# Altium footprint library Zmod.PcbLib: 229 footprints (part 2 of 15)
Each footprint in its own frame and in the unit in brackets; x right, y up, seen from the top. Pads: shape width x height; smd on the part's side, far side on the other; paste and mask are expansions set on the pad; w line width, h text height; cw(c..) or ccw(c..) is an arc to the next point about the centre after c.
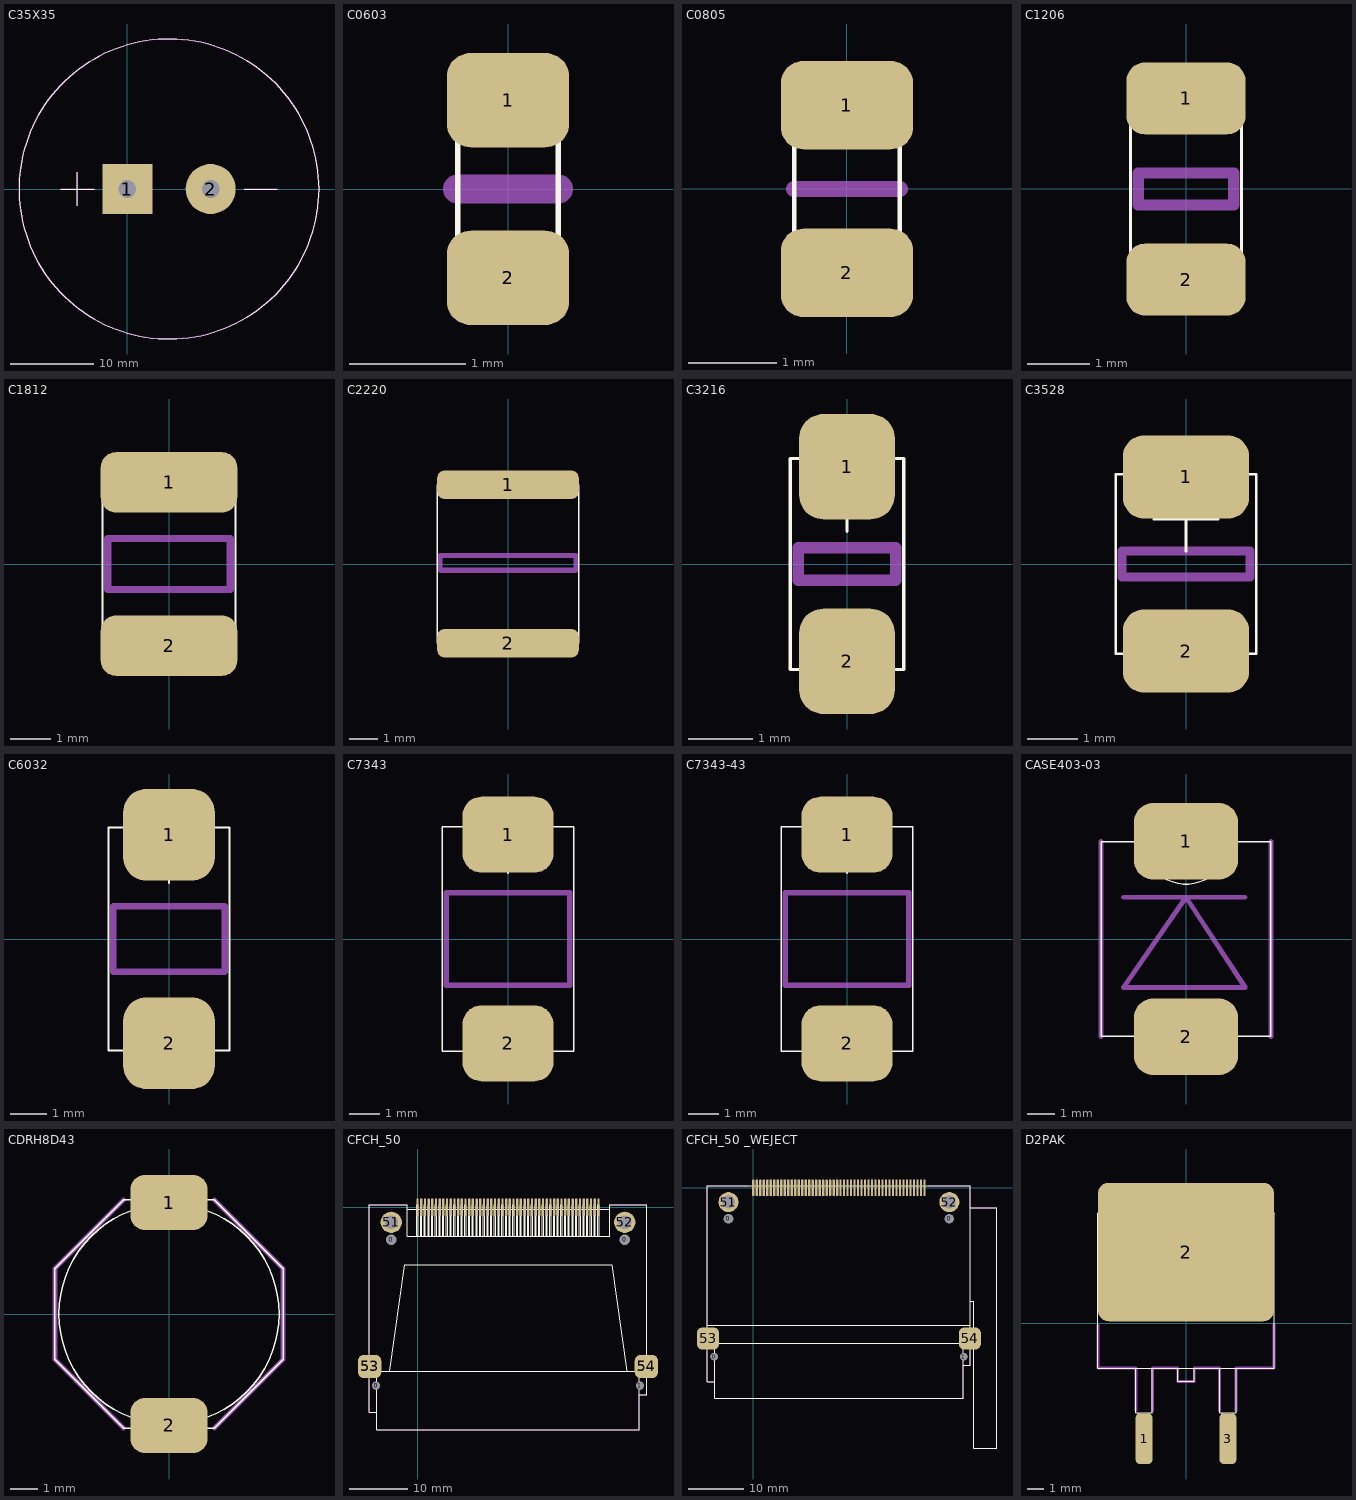
[diagram p1: the footprints below, top view; thin cyan lines are the x and y axes]

## C35X35 [mm] "Diameter 10mm pitch, 35mm, height 37mm, Rev. 1"
height 37
pads (2):
  rect 6x6 hole 2.1: 1(0,0)
  round 6 hole 2.1: 2(10,0)
Top Overlay:
  circle w0.05: c5,0 r18
  lines w0.05: -8,0 -4,0 ; -6,-2 -6,2 ; 14,0 18,0
  text ".Designator" at -1.2,4.3 h1.5
Mechanical 15:
  circle w0.18: c5,0 r18
  lines w0.18: -8,0 -4,0 ; -6,-2 -6,2 ; 14,0 18,0

## C0603 [mm]
height 0.889
pads (2):
  rrect50% 1.05x0.81 smd: 1(0,0.762) 2(0,-0.762)
Top Overlay:
  lines w0.05: -0.432,-0.787 0.432,-0.787 0.432,0.787 -0.432,0.787 -0.432,-0.787
Mechanical 15:
  lines w0.25: -0.432,0 0.432,0
  text ".Designator" at 0,-0.127 h1.5

## C0805 [mm] "Rev.1"
height 0.75
pads (2):
  rrect50% 1.5x1 smd: 1(0,0.95) 2(0,-0.95)
Top Overlay:
  lines w0.05: -0.6,0.75 -0.6,1 0.15,1 0.6,1 0.6,-1 -0.6,-1 -0.6,0.8
Mechanical 15:
  lines w0.18: -0.6,0 0.6,0
  text ".Designator" at 0.3,-1 h1.5

## C1206 [mm]
height 1.524
pads (2):
  rrect50% 1.9x1.15 smd: 1(0,1.448) 2(0,-1.448)
Top Overlay:
  lines w0.05: -0.889,-1.651 -0.889,1.651 0.889,1.651 0.889,-1.651 -0.889,-1.651
Mechanical 15:
  lines w0.18: -0.762,-0.254 -0.762,0.254 0.762,0.254 0.762,-0.254 -0.762,-0.254
  text ".Designator" at -0.127,0 h1.5

## C1812 [mm]
height 1.905
pads (2):
  rrect50% 3.4x1.5 smd: 1(0,2.032) 2(0,-2.032)
Top Overlay:
  lines w0.05: -1.651,-2.286 -1.651,2.286 1.651,2.286 1.651,-2.286 -1.651,-2.286
Mechanical 15:
  lines w0.18: -1.524,-0.635 -1.524,0.635 1.524,0.635 1.524,-0.635 -1.524,-0.635
  text ".Designator" at 0,-0.127 h1.5

## C2220 [mm] "AVX Rev. 2"
height 1
pads (2):
  rrect50% 5x1 smd: 1(0,2.8) 2(0,-2.8)
Top Overlay:
  lines w0.05: 2.5,-0.167 2.5,2.8 ; 2.5,2.8 -2.5,2.8 -2.5,-2.8 2.5,-2.8 2.5,2.8
Mechanical 15:
  lines w0.18: -2.4,-0.2 -2.38,-0.22 2.38,-0.22 2.4,-0.2 2.4,0.3 -2.4,0.3 -2.4,-0.2
  text ".Designator" at -0.127,0 h1.5

## C3216 [mm]
height 1.905
pads (2):
  rrect50% 1.5x1.65 smd: 1(0,1.524) 2(0,-1.524)
Top Overlay:
  lines w0.05: -0.508,1.016 0.508,1.016 ; 0,0.508 0,1.524 ; -0.889,-1.651 -0.889,1.651 0.889,1.651 0.889,-1.651 -0.889,-1.651
Mechanical 15:
  lines w0.18: -0.762,-0.254 -0.762,0.254 0.762,0.254 0.762,-0.254 -0.762,-0.254
  text ".Designator" at 0,0 h1.5
  text "+" at -0.127,0.254 h2

## C3528 [mm]
height 2.159
pads (2):
  rrect50% 2.5x1.65 smd paste+0: 1(0,1.727) 2(0,-1.727)
Top Overlay:
  lines w0.05: -0.635,0.889 0.635,0.889 ; 0,0.254 0,1.524 ; -1.397,-1.778 -1.397,1.778 1.397,1.778 1.397,-1.778 -1.397,-1.778
Mechanical 15:
  lines w0.18: -1.27,-0.254 -1.27,0.254 1.27,0.254 1.27,-0.254 -1.27,-0.254
  text ".Designator" at 0,0.254 h1.5
  text "+" at 0.127,0.254 h2

## C6032 [mm]
height 2.794
pads (2):
  rrect50% 2.5x2.5 smd paste+0: 1(0,2.845) 2(0,-2.845)
Top Overlay:
  lines w0.05: -0.635,2.159 0.635,2.159 ; 0,1.524 0,2.794 ; -1.651,-3.048 1.651,-3.048 1.651,3.048 -1.651,3.048 -1.651,-3.048
Mechanical 15:
  lines w0.18: -1.524,-0.889 1.524,-0.889 1.524,0.889 -1.524,0.889 -1.524,-0.889
  text ".Designator" at 0,0 h1.5
  text "+" at 0.381,1.143 h2

## C7343 [mm]
height 3.175
pads (2):
  rrect50% 3x2.5 smd paste+0: 1(0,3.429) 2(0,-3.429)
Top Overlay:
  lines w0.05: -0.635,2.794 0.635,2.794 ; 0,2.159 0,3.429 ; -2.159,-3.683 -2.159,3.683 2.159,3.683 2.159,-3.683 -2.159,-3.683
Mechanical 15:
  lines w0.18: -2.032,-1.524 -2.032,1.524 2.032,1.524 2.032,-1.524 -2.032,-1.524
  text "+" at 0.508,1.905 h2
  text ".Designator" at 0,0 h1.5

## C7343-43 [mm] "Rev. 1 Kemet T495 Case size X"
height 4.3
pads (2):
  rrect50% 3x2.5 smd paste+0: 1(0,3.429) 2(0,-3.429)
Top Overlay:
  lines w0.05: -0.635,2.794 0.635,2.794 ; 0,2.159 0,3.429 ; -2.159,-3.683 2.159,-3.683 2.159,3.683 -2.159,3.683 -2.159,-3.683
Mechanical 15:
  lines w0.18: -2.032,-1.524 2.032,-1.524 2.032,1.524 -2.032,1.524 -2.032,-1.524
  text ".Designator" at 0,0 h1.5
  text "+" at 0.508,1.905 h2

## CASE403-03 [mm] "OnSemi device, body L7.11,W6.1. Rev. 1"
height 2.41
pads (2):
  rrect50% 3.81x2.8 smd: 1(0,3.57) 2(0,-3.57)
Top Overlay:
  lines w0.05: -1.524,-3.556 -1.524,-4.064 1.524,-4.064 1.524,-3.556 ; -1.524,3.556 -1.524,4.064 1.524,4.064 1.524,3.556 ; -1.5,3.5 ccw(c0,3.5) 1.5,3.5 ; -3.1,-3.556 -3.1,3.556 3.1,3.556 3.1,-3.556 -3.1,-3.556
Mechanical 15:
  lines w0.18: -3.1,-3.556 -3.1,3.556 ; -2.286,1.524 2.159,1.524 ; 3.1,-3.556 3.1,3.556 ; -2.286,-1.778 2.159,-1.778 0,1.524 -2.286,-1.778
  text ".Designator" at 0.776,-3.829 h1.5

## CDRH8D43 [mm] "Sumida Inductor"
height 4.5
pads (2):
  rrect50% 2.8x2 smd: 1(0,4.05) 2(0,-4.05)
Top Overlay:
  circle w0.05: c0,0 r4
  lines w0.05: -4.15,-1.65 -1.65,-4.15 1.65,-4.15 4.15,-1.65 4.15,1.65 1.65,4.15 -1.65,4.15 -4.15,1.65 -4.15,-1.65
Mechanical 15:
  lines w0.18: -1.65,-4.15 -4.15,-1.65 -4.15,1.65 -1.65,4.15 ; 1.65,-4.15 4.15,-1.65 4.15,1.65 1.65,4.15
  text ".Designator" at -3.3,0 h1.5

## CFCH_50 [mm] "Connector; CompactFlash Card Header, SM; Normal Polarization; 50 Position; Right Angle; Pitch 0.635 mm"
height 8.3
pads (58):
  round 1.35 hole 1.35: 0(-7.14,-30.7) 1(38.26,-30.7)
  round 1.4 hole 1.75 unplated: 0(-4.52,-5.6) 0(35.64,-5.6)
  rrect50% 0.4x3 smd: 1(0,0) 2(1.27,0) 3(2.54,0) 4(3.81,0) 5(5.08,0) 6(6.35,0) 7(7.62,0) 8(8.89,0) 9(10.16,0) 10(11.43,0) 11(12.7,0) 12(13.97,0) 13(15.24,0) 14(16.51,0) 15(17.78,0) 16(19.05,0) 17(20.32,0) 18(21.59,0) 19(22.86,0) 20(24.13,0) 21(25.4,0) 22(26.67,0) 23(27.94,0) 24(29.21,0) 25(30.48,0) 26(0.635,0) 27(1.905,0) 28(3.175,0) 29(4.445,0) 30(5.715,0) 31(6.985,0) 32(8.255,0) 33(9.525,0) 34(10.795,0) 35(12.065,0) 36(13.335,0) 37(14.605,0) 38(15.875,0) 39(17.145,0) 40(18.415,0) 41(19.685,0) 42(20.955,0) 43(22.225,0) 44(23.495,0) 45(24.765,0) 46(26.035,0) 47(27.305,0) 48(28.575,0) 49(29.845,0) 50(31.115,0)
  round 3.65 hole 2.3: 51(-4.52,-2.6) 52(35.64,-2.6)
  rrect50% 4x4 smd: 53(-8.24,-27.4) 54(39.36,-27.4)
Top Overlay:
  drawing of 226 lines, arcs and shapes, not listed
Mechanical 15:
  lines w0.18: -8.34,-29.77 -8.34,-35.25 -7,-35.25 -7,-38.25 38.12,-38.25 38.12,-32.25 39.46,-32.25 39.46,-29.63 ; -8.34,-25 -8.34,0.39 ; -8.34,0.4 -1.8,0.4 ; 33.1,0.41 33.11,0.4 39.46,0.4 39.46,-24.99
  text ".Designator" at 10.7,-8.2 h1.5

## CFCH_50 _WEJECT [mm] "Connector; CompactFlash Card Header, SM; Normal Polarization; 50 Position; Right Angle; Pitch 0.635 mm"
height 8.3
pads (58):
  round 1.35 hole 1.35: 0(-7.14,-30.7) 1(38.26,-30.7)
  round 1.4 hole 1.75 unplated: 0(-4.52,-5.6) 0(35.64,-5.6)
  rrect50% 0.4x3 smd: 1(0,0) 2(1.27,0) 3(2.54,0) 4(3.81,0) 5(5.08,0) 6(6.35,0) 7(7.62,0) 8(8.89,0) 9(10.16,0) 10(11.43,0) 11(12.7,0) 12(13.97,0) 13(15.24,0) 14(16.51,0) 15(17.78,0) 16(19.05,0) 17(20.32,0) 18(21.59,0) 19(22.86,0) 20(24.13,0) 21(25.4,0) 22(26.67,0) 23(27.94,0) 24(29.21,0) 25(30.48,0) 26(0.635,0) 27(1.905,0) 28(3.175,0) 29(4.445,0) 30(5.715,0) 31(6.985,0) 32(8.255,0) 33(9.525,0) 34(10.795,0) 35(12.065,0) 36(13.335,0) 37(14.605,0) 38(15.875,0) 39(17.145,0) 40(18.415,0) 41(19.685,0) 42(20.955,0) 43(22.225,0) 44(23.495,0) 45(24.765,0) 46(26.035,0) 47(27.305,0) 48(28.575,0) 49(29.845,0) 50(31.115,0)
  round 3.65 hole 2.3: 51(-4.52,-2.6) 52(35.64,-2.6)
  rrect50% 4x4 smd: 53(-8.24,-27.4) 54(39.36,-27.4)
Top Overlay:
  lines w0.05: -8.34,-25.03 -8.33,-25.02 39.47,-25.02 ; 39.46,-20.6 40.1,-20.6 40.1,-47.4 44.3,-47.4 44.3,-3.6 39.47,-3.6 39.46,-3.59 ; -7,-35.25 -8.34,-35.25 -8.34,0.4 -1.8,0.4 33.1,0.4 39.46,0.4 39.46,-32.25 38.12,-32.25 ; -7,-35.25 -7,-28.25 38.11,-28.25 ; -7,-35.25 -7,-38.25 38.12,-38.25 38.12,-32.25 ; 38.11,-28.25 38.12,-28.26 ; 38.11,-28.25 38.12,-28.26 ; 38.12,-32.25 38.12,-28.26
Mechanical 15:
  lines w0.18: -8.34,-29.77 -8.34,-35.25 -7,-35.25 -7,-38.25 38.12,-38.25 38.12,-32.25 39.46,-32.25 39.46,-29.63 ; -8.34,-25 -8.34,0.39 ; -8.34,0.4 -0.91,0.4 ; 31.78,0.4 39.46,0.4 39.46,-3.6 ; 39.5,-3.6 44.3,-3.6 44.3,-47.4 40.1,-47.4 40.1,-29.7
  text ".Designator" at 10.7,-8.2 h1.5

## D2PAK [mm]
height 4.9
pads (3):
  rrect50% 1.016x3.05 smd: 1(-2.54,-6.985) 3(2.54,-6.985)
  rrect15% 10.66x8.38 smd: 2(0,4.32)
Top Overlay:
  lines w0.05: -5.33,6.55 5.33,6.55 ; -3.04,-2.7 -3.04,-5.4 -2.04,-5.4 -2.04,-2.7 ; -2.88,-5.4 -2.88,-7.95 -2.21,-7.95 -2.21,-5.4 ; -0.51,-2.7 -0.51,-3.5 0.49,-3.5 0.49,-2.71 ; 2.04,-2.7 2.04,-5.4 3.04,-5.4 3.04,-2.7 ; 2.2,-5.4 2.2,-7.95 2.87,-7.95 2.87,-5.4 ; -5.33,-2.7 5.33,-2.7 5.33,6.67 4.05,7.95 -4.05,7.95 -5.33,6.67 -5.33,-2.7
Mechanical 15:
  lines w0.18: -5.33,-0.09 -5.33,-2.69 -3.04,-2.69 -3.04,-5.27 ; -2.04,-5.29 -2.04,-2.7 -0.5,-2.7 -0.5,-3.51 0.5,-3.51 0.5,-2.7 ; 0.51,-2.69 2.04,-2.69 2.04,-5.3 ; 3.04,-5.31 3.04,-2.7 5.33,-2.7 5.33,-0.08
  text ".Designator" at -5.055,-1.827 h1.5